# Altium footprint library 封装库.PcbLib: 755 footprints (part 23 of 48)
Each footprint in its own frame and in the unit in brackets; x right, y up, seen from the top. Pads: shape width x height; smd on the part's side, far side on the other; paste and mask are expansions set on the pad; w line width, h text height; cw(c..) or ccw(c..) is an arc to the next point about the centre after c.
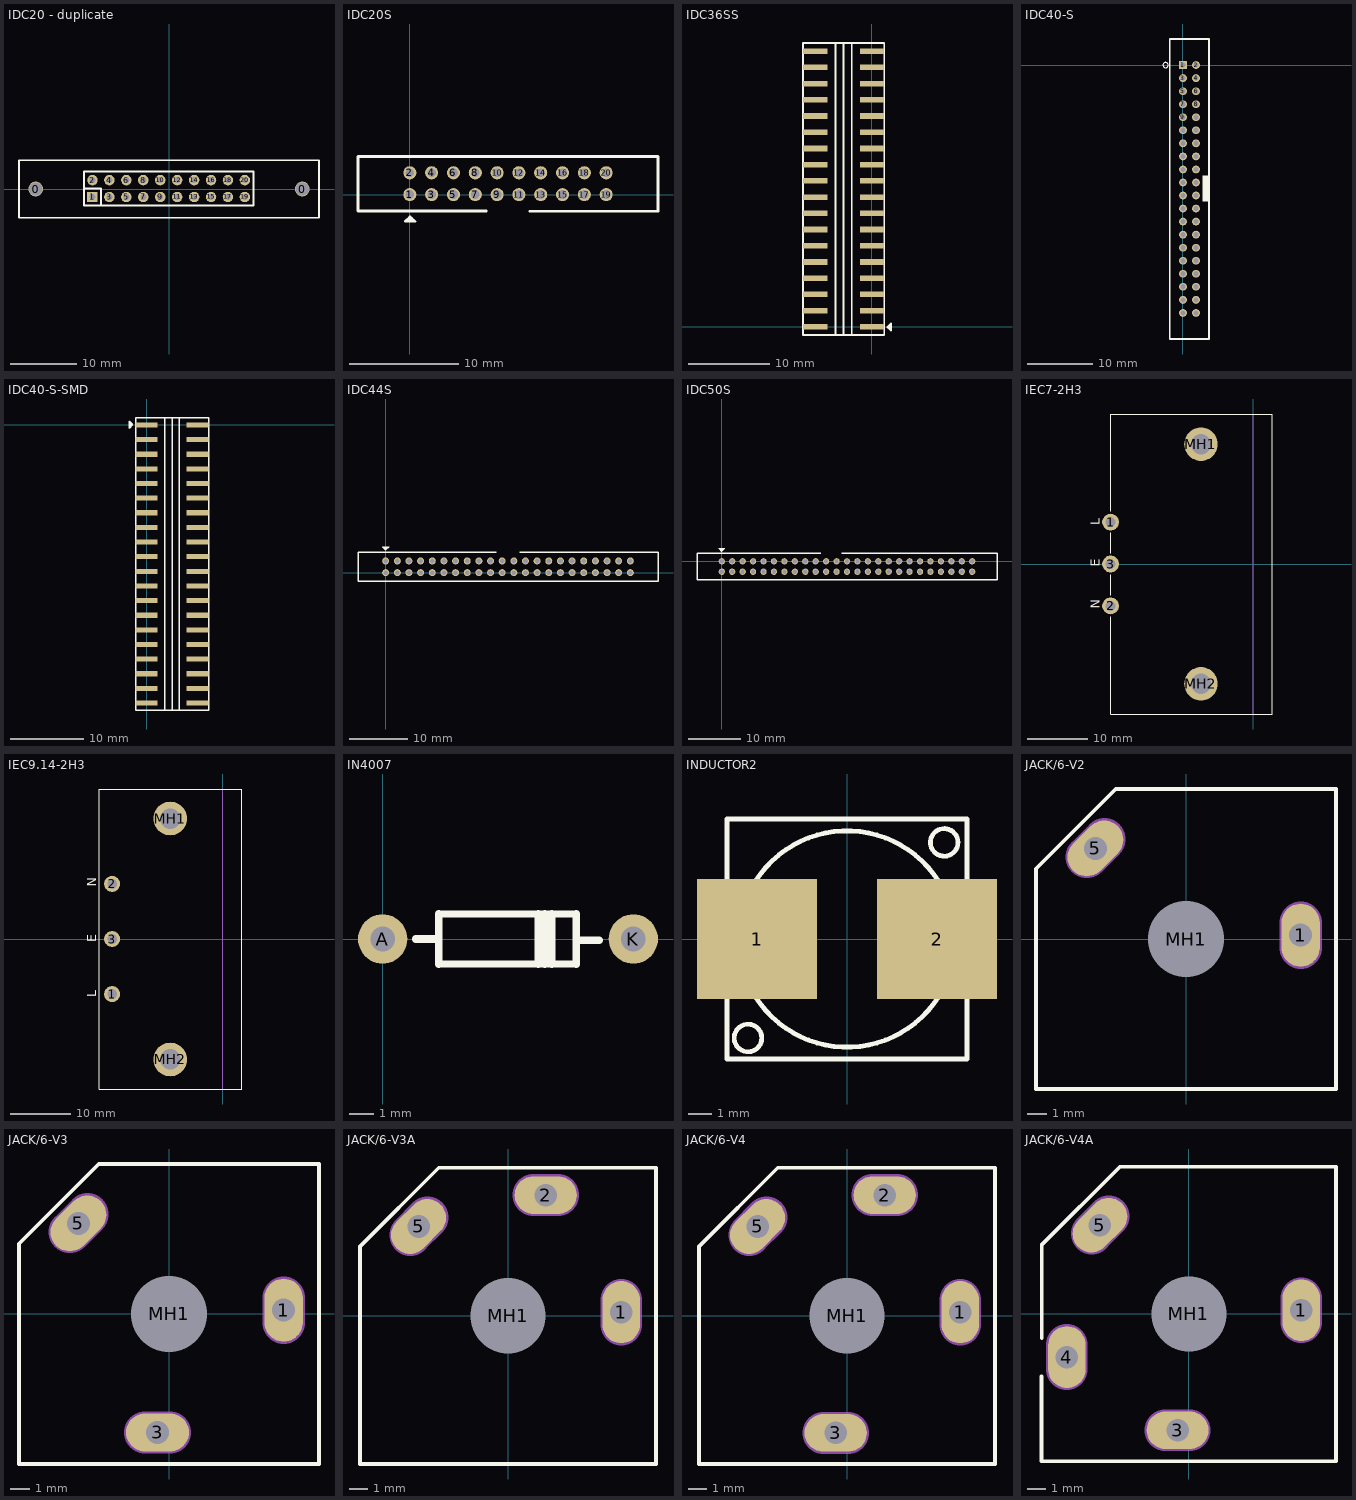
[diagram p22: the footprints below, top view; thin cyan lines are the x and y axes]

## IDC20 - duplicate [mm]
pads (22):
  round 2.2 hole 2: 0(-20,0) 0(20,0)
  rect 1.575x1.575 hole 0.9: 1(-11.476,-1.2)
  round 1.575 hole 0.9: 2(-11.476,1.34) 3(-8.936,-1.2) 4(-8.936,1.34) 5(-6.396,-1.2) 6(-6.396,1.34) 7(-3.856,-1.2) 8(-3.856,1.34) 9(-1.316,-1.2) 10(-1.316,1.34) 11(1.224,-1.2) 12(1.224,1.34) 13(3.764,-1.2) 14(3.764,1.34) 15(6.304,-1.2) 16(6.304,1.34) 17(8.844,-1.2) 18(8.844,1.34) 19(11.384,-1.2) 20(11.384,1.34)
Top Overlay:
  lines w0.254: -22.5,-4.3 -22.5,4.3 22.5,4.3 22.5,-4.3 -22.5,-4.3
  lines w0.305: -12.746,0.07 -10.206,0.07 -10.206,-2.47 ; -12.746,-2.47 12.654,-2.47 12.654,2.61 -12.746,2.61 -12.746,-2.47

## IDC20S [mm]
pads (20):
  round 1.2 hole 0.8: 1(-0.003,-0.008) 2(-0.003,1.992) 3(1.997,-0.008) 4(1.997,1.992) 5(3.997,-0.008) 6(3.997,1.992) 7(5.997,-0.008) 8(5.997,1.992) 9(7.997,-0.008) 10(7.997,1.992) 11(9.997,-0.008) 12(9.997,1.992) 13(11.997,-0.008) 14(11.997,1.992) 15(13.997,-0.008) 16(13.997,1.992) 17(15.997,-0.008) 18(15.997,1.992) 19(17.997,-0.008) 20(17.997,1.992)
Top Overlay:
  lines w0.2: 0.308,-2.294 -0.238,-2.294 -0.252,-2.281 0.103,-2.281 0.199,-2.185 0.199,-2.256 -0.028,-2.483 -0.028,-2.058 -0.003,-2.033 ; -0.003,-2.033 0.047,-2.033 0.497,-2.483 0.297,-2.483 -0.453,-2.483 -0.003,-2.033
  lines w0.254: 6.997,-1.508 -4.753,-1.508 -4.753,3.492 22.747,3.492 22.747,-1.508 ; 10.997,-1.533 22.747,-1.533

## IDC36SS [mm]
pads (36):
  rect 3x0.7 smd: 1(0.001,0.007) 2(-6.999,0.007) 3(0.001,2.007) 4(-6.999,2.007) 5(0.001,4.007) 6(-6.999,4.007) 7(0.001,6.007) 8(-6.999,6.007) 9(0.001,8.007) 10(-6.999,8.007) 11(0.001,10.007) 12(-6.999,10.007) 13(0.001,12.007) 14(-6.999,12.007) 15(0.001,14.007) 16(-6.999,14.007) 17(0.001,16.007) 18(-6.999,16.007) 19(0.001,18.007) 20(-6.999,18.007) 21(0.001,20.007) 22(-6.999,20.007) 23(0.001,22.007) 24(-6.999,22.007) 25(0.001,24.007) 26(-6.999,24.007) 27(0.001,26.007) 28(-6.999,26.007) 29(0.001,28.007) 30(-6.999,28.007) 31(0.001,30.007) 32(-6.999,30.007) 33(0.001,32.007) 34(-6.999,32.007) 35(0.001,34.007) 36(-6.999,34.007)
Top Overlay:
  lines w0.2: -4.499,-0.968 -4.499,35.007 ; -3.499,-0.993 -3.499,35.007 ; -2.499,-0.993 -2.499,35.007 ; 2.351,0.132 2.079,0.132 2.065,0.146 2.065,0.143 2.351,-0.143 2.076,-0.143 1.926,0.007 ; 1.926,0.007 1.926,-0.068 2.351,-0.493 2.351,0.432 1.926,0.007 ; -8.499,-0.993 1.501,-0.993 1.501,35.007 -8.499,35.007 -8.499,-0.993

## IDC40-S [mm]
pads (40):
  rect 1.2x1.2 hole 0.8: 1(0,0)
  round 1.2 hole 0.8: 2(2,0) 3(0,-2) 4(2,-2) 5(0,-4) 6(2,-4) 7(0,-6) 8(2,-6) 9(0,-8) 10(2,-8) 11(0,-10) 12(2,-10) 13(0,-12) 14(2,-12) 15(0,-14) 16(2,-14) 17(0,-16) 18(2,-16) 19(0,-18) 20(2,-18) 21(0,-20) 22(2,-20) 23(0,-22) 24(2,-22) 25(0,-24) 26(2,-24) 27(0,-26) 28(2,-26) 29(0,-28) 30(2,-28) 31(0,-30) 32(2,-30) 33(0,-32) 34(2,-32) 35(0,-34) 36(2,-34) 37(0,-36) 38(2,-36) 39(0,-38) 40(2,-38)
Top Overlay:
  circle w0.127: c-2.667,0 r0.402
  rectangle: 2.997,-18.923 3.997,-16.923
  rectangle: 3,-20.923 4,-18.923
  lines w0.254: -2,-40 -2,-42 3.918,-42 ; -2,-39.935 -2,-28 -2,4 -1,4 3,4 4,4 4,-28 4,-39.983 3.983,-40 ; 4,-42 4,-40

## IDC40-S-SMD [mm]
pads (40):
  rect 3x0.7 smd: 1(0,0) 2(7,0) 3(0,-2) 4(7,-2) 5(0,-4) 6(7,-4) 7(0,-6) 8(7,-6) 9(0,-8) 10(7,-8) 11(0,-10) 12(7,-10) 13(0,-12) 14(7,-12) 15(0,-14) 16(7,-14) 17(0,-16) 18(7,-16) 19(0,-18) 20(7,-18) 21(0,-20) 22(7,-20) 23(0,-22) 24(7,-22) 25(0,-24) 26(7,-24) 27(0,-26) 28(7,-26) 29(0,-28) 30(7,-28) 31(0,-30) 32(7,-30) 33(0,-32) 34(7,-32) 35(0,-34) 36(7,-34) 37(0,-36) 38(7,-36) 39(0,-38) 40(7,-38)
Top Overlay:
  lines w0.2: -2.35,-0.125 -2.078,-0.125 -2.064,-0.139 -2.064,-0.136 -2.35,0.15 -2.075,0.15 -1.925,0 ; 2.5,-39 2.5,1 ; 3.5,-39 3.5,1 ; 4.5,-39 4.5,0.975 ; -1.925,0 -1.925,0.075 -2.35,0.5 -2.35,-0.425 -1.925,0 ; -1.5,-39 8.5,-39 8.5,1 -1.5,1 -1.5,-39

## IDC44S [mm]
pads (44):
  round 1.2 hole 0.8: 1(0.003,1.994) 2(0.003,-0.006) 3(2.003,1.994) 4(2.003,-0.006) 5(4.003,1.994) 6(4.003,-0.006) 7(6.003,1.994) 8(6.003,-0.006) 9(8.003,1.994) 10(8.003,-0.006) 11(10.003,1.994) 12(10.003,-0.006) 13(12.003,1.994) 14(12.003,-0.006) 15(14.003,1.994) 16(14.003,-0.006) 17(16.003,1.994) 18(16.003,-0.006) 19(18.003,1.994) 20(18.003,-0.006) 21(20.003,1.994) 22(20.003,-0.006) 23(22.003,1.994) 24(22.003,-0.006) 25(24.003,1.994) 26(24.003,-0.006) 27(26.003,1.994) 28(26.003,-0.006) 29(28.003,1.994) 30(28.003,-0.006) 31(30.003,1.994) 32(30.003,-0.006) 33(32.003,1.994) 34(32.003,-0.006) 35(34.003,1.994) 36(34.003,-0.006) 37(36.003,1.994) 38(36.003,-0.006) 39(38.003,1.994) 40(38.003,-0.006) 41(40.003,1.994) 42(40.003,-0.006) 43(42.003,1.994) 44(42.003,-0.006)
Top Overlay:
  lines w0.2: 0.144,4.185 0.144,4.153 0.003,4.294 0.003,4.068 -0.29,4.36 0.394,4.36 -0.056,3.91 ; -0.606,4.46 -0.056,3.91 ; -0.606,4.46 -0.606,4.46 ; -0.606,4.46 0.394,4.46 0.594,4.46 0.044,3.91 -0.056,3.91
  lines w0.254: 19.003,3.494 -4.747,3.494 -4.747,-1.506 46.753,-1.506 46.753,3.494 23.003,3.494

## IDC50S [mm]
pads (50):
  round 1.2 hole 0.8: 1(0.006,-0.012) 2(0.006,-2.012) 3(2.006,-0.012) 4(2.006,-2.012) 5(4.006,-0.012) 6(4.006,-2.012) 7(6.006,-0.012) 8(6.006,-2.012) 9(8.006,-0.012) 10(8.006,-2.012) 11(10.006,-0.012) 12(10.006,-2.012) 13(12.006,-0.012) 14(12.006,-2.012) 15(14.006,-0.012) 16(14.006,-2.012) 17(16.006,-0.012) 18(16.006,-2.012) 19(18.006,-0.012) 20(18.006,-2.012) 21(20.006,-0.012) 22(20.006,-2.012) 23(22.006,-0.012) 24(22.006,-2.012) 25(24.006,-0.012) 26(24.006,-2.012) 27(26.006,-0.012) 28(26.006,-2.012) 29(28.006,-0.012) 30(28.006,-2.012) 31(30.006,-0.012) 32(30.006,-2.012) 33(32.006,-0.012) 34(32.006,-2.012) 35(34.006,-0.012) 36(34.006,-2.012) 37(36.006,-0.012) 38(36.006,-2.012) 39(38.006,-0.012) 40(38.006,-2.012) 41(40.006,-0.012) 42(40.006,-2.012) 43(42.006,-0.012) 44(42.006,-2.012) 45(44.006,-0.012) 46(44.006,-2.012) 47(46.006,-0.012) 48(46.006,-2.012) 49(48.006,-0.012) 50(48.006,-2.012)
Top Overlay:
  lines w0.2: 0.147,2.179 0.147,2.146 0.006,2.288 0.006,2.061 -0.287,2.354 0.397,2.354 -0.053,1.904 ; -0.053,1.904 -0.603,2.454 0.397,2.454 0.597,2.454 0.047,1.904 -0.053,1.904
  lines w0.254: 19.006,1.488 -4.744,1.488 -4.744,-3.512 52.756,-3.512 52.756,1.488 23.006,1.488

## IEC7-2H3 [mm] "Mains Power Outlet, IEC60 320-2-2 F, PC Flange Rear Mount"
height 30.4
pads (5):
  round 2.8 hole 1.7: 1(-23.8,7) 2(-23.8,-7) 3(-23.8,0)
  round 5.6 hole 3.4: MH1(-8.7,20) MH2(-8.7,-20)
Top Overlay:
  lines w0.2: -23.8,-8.8 -23.8,-25.05 3.2,-25.05 3.2,25.05 -23.8,25.05 -23.8,8.8 ; -23.8,-5.2 -23.8,-1.8 ; -23.8,1.8 -23.8,5.2
  text "L" at -25.6,6.5 h1.5
  text "E" at -25.6,-0.5 h1.5
  text "N" at -25.6,-7.5 h1.5
Mechanical 1:
  lines w0.1: 0,-25.05 0,25.05
  text "PCB Edge" at -0.4,-24.4 h0.5

## IEC9.14-2H3 [mm] "Mains Power Inlet, IEC60 320-1 C14, PC Flange Rear Mount"
height 27.8
pads (5):
  round 2.65 hole 1.6: 1(-18.35,-9.14) 2(-18.35,9.14) 3(-18.35,0)
  round 5.6 hole 3.4: MH1(-8.7,20) MH2(-8.7,-20)
Top Overlay:
  lines w0.2: -20.5,-24.9 -20.5,24.9 3.2,24.9 3.2,-24.9 -20.5,-24.9
  text "N" at -21,8.64 h1.5
  text "E" at -21,-0.5 h1.5
  text "L" at -21,-9.64 h1.5
Mechanical 1:
  lines w0.1: 0,-24.9 0,24.9
  text "PCB Edge" at -0.383,-24.4 h0.5

## IN4007 [mm]
pads (2):
  round 2 hole 1: A(0,0) K(10.16,0)
Top Overlay:
  lines w0.305: 1.35,0 2.282,0 ; 2.282,-1.016 2.282,1.016 ; 2.289,-1.007 7.841,-1.014 ; 2.289,1.007 7.841,1.014 ; 6.3,-1.016 6.3,1.016 ; 6.575,-1.016 6.575,1.016 ; 6.85,-1.016 6.85,1.016 ; 7.853,-1.016 7.853,1.016 ; 7.853,-0.05 8.785,-0.05

## INDUCTOR2 [mm]
pads (2):
  rect 5.08x5.08 smd: 1(-3.81,0) 2(3.81,0)
Top Overlay:
  circle w0.203: c4.115,4.089 r0.584
  circle w0.203: c-4.191,-4.191 r0.584
  circle w0.203: c0,0 r4.579
  lines w0.203: -5.08,-5.08 -5.08,5.08 5.08,5.08 5.08,-5.08 -5.08,-5.08

## JACK/6-V2 [mm] "Connector; Jack Socket, 1/4\" [6.5mm], Thru-Hole, 2 Position, Vertical, Body 15.7 x 15.7 x 31 mm (WxTxH)"
height 31.1
pads (3):
  oval 2x3.3 hole 1.2: 1(6,0.2)
  oval 2x3.3 hole 1.2 rot 135: 5(-4.738,4.738)
  round 3.7 hole 4: MH1(0,0)
Top Overlay:
  lines w0.2: -7.85,-7.85 7.85,-7.85 7.85,7.85 -3.675,7.85 -7.85,3.675 -7.85,-7.85
Mechanical 1:
  lines w1.2: -5.185,4.295 -4.266,5.214 ; 6,-0.45 6,0.85
  text "Alert PCB fab to slot details" at -7.9,9.66 h0.3
  text "Slot 1.2x2.5mm, PTH" at -7.9,9.16 h0.3
  text "Assign keep-out area to slot" at -7.9,10.16 h0.3
  text "Mech 1 - Slot cut-out" at -7.9,8.66 h0.3
  text "Mech 2 - Clearance, move to internal plane if present" at -7.9,8.16 h0.3
Mechanical 2:
  lines w2.216: -5.185,4.295 -4.266,5.214 ; 6,-0.45 6,0.85

## JACK/6-V3 [mm] "Connector; Jack Socket, 1/4\" [6.5mm], Thru-Hole, 3 Position, Vertical, Body 15.7 x 15.7 x 31 mm (WxTxH)"
height 31.1
pads (4):
  oval 2x3.3 hole 1.2: 1(6,0.2)
  oval 3.3x2 hole 1.2: 3(-0.6,-6.2)
  oval 2x3.3 hole 1.2 rot 135: 5(-4.738,4.738)
  round 3.7 hole 4: MH1(0,0)
Top Overlay:
  lines w0.2: -7.85,-7.85 -7.85,3.675 -3.675,7.85 7.85,7.85 7.85,-7.85 -7.85,-7.85
Mechanical 1:
  lines w1.2: -5.185,4.295 -4.266,5.214 ; -1.25,-6.2 0.05,-6.2 ; 6,-0.45 6,0.85
  text "Mech 2 - Clearance, move to internal plane if present" at -7.9,8.16 h0.3
  text "Mech 1 - Slot cut-out" at -7.9,8.66 h0.3
  text "Assign keep-out area to slot" at -7.9,10.16 h0.3
  text "Slot 1.2x2.5mm, PTH" at -7.9,9.16 h0.3
  text "Alert PCB fab to slot details" at -7.9,9.66 h0.3
Mechanical 2:
  lines w2.216: -5.185,4.295 -4.266,5.214 ; -1.25,-6.2 0.05,-6.2 ; 6,-0.45 6,0.85

## JACK/6-V3A [mm] "Connector; Jack Socket, 1/4\" [6.5mm], Thru-Hole, 3 Position, Vertical, Body 15.7 x 15.7 x 31 mm (WxTxH)"
height 31.1
pads (4):
  oval 2x3.3 hole 1.2: 1(6,0.2)
  oval 3.3x2 hole 1.2: 2(2,6.4)
  oval 2x3.3 hole 1.2 rot 135: 5(-4.738,4.738)
  round 3.7 hole 4: MH1(0,0)
Top Overlay:
  lines w0.2: -7.85,-7.85 7.85,-7.85 7.85,7.85 -3.675,7.85 -7.85,3.675 -7.85,-7.85
Mechanical 1:
  lines w1.2: -5.185,4.295 -4.266,5.214 ; 1.35,6.4 2.65,6.4 ; 6,-0.45 6,0.85
  text "Mech 2 - Clearance, move to internal plane if present" at -7.9,8.16 h0.3
  text "Mech 1 - Slot cut-out" at -7.9,8.66 h0.3
  text "Assign keep-out area to slot" at -7.9,10.16 h0.3
  text "Slot 1.2x2.5mm, PTH" at -7.9,9.16 h0.3
  text "Alert PCB fab to slot details" at -7.9,9.66 h0.3
Mechanical 2:
  lines w2.216: -5.185,4.295 -4.266,5.214 ; 1.35,6.4 2.65,6.4 ; 6,-0.45 6,0.85

## JACK/6-V4 [mm] "Connector; Jack Socket, 1/4\" [6.5mm], Thru-Hole, 4 Position, Vertical, Body 15.7 x 15.7 x 31 mm (WxTxH)"
height 31.1
pads (5):
  oval 2x3.3 hole 1.2: 1(6,0.2)
  oval 3.3x2 hole 1.2: 2(2,6.4) 3(-0.6,-6.2)
  oval 2x3.3 hole 1.2 rot 135: 5(-4.738,4.738)
  round 3.7 hole 4: MH1(0,0)
Top Overlay:
  lines w0.2: -7.85,-7.85 7.85,-7.85 7.85,7.85 -3.675,7.85 -7.85,3.675 -7.85,-7.85
Mechanical 1:
  lines w1.2: -5.185,4.295 -4.266,5.214 ; -1.25,-6.2 0.05,-6.2 ; 1.35,6.4 2.65,6.4 ; 6,-0.45 6,0.85
  text "Mech 2 - Clearance, move to internal plane if present" at -7.9,8.16 h0.3
  text "Mech 1 - Slot cut-out" at -7.9,8.66 h0.3
  text "Assign keep-out area to slot" at -7.9,10.16 h0.3
  text "Slot 1.2x2.5mm, PTH" at -7.9,9.16 h0.3
  text "Alert PCB fab to slot details" at -7.9,9.66 h0.3
Mechanical 2:
  lines w2.216: -5.185,4.295 -4.266,5.214 ; -1.25,-6.2 0.05,-6.2 ; 1.35,6.4 2.65,6.4 ; 6,-0.45 6,0.85

## JACK/6-V4A [mm] "Connector; Jack Socket, 1/4\" [6.5mm], Thru-Hole, 4 Position, Vertical, Body 15.7 x 15.7 x 31 mm (WxTxH)"
height 31.1
pads (5):
  oval 2x3.3 hole 1.2: 1(6,0.2) 4(-6.5,-2.3)
  oval 3.3x2 hole 1.2: 3(-0.6,-6.2)
  oval 2x3.3 hole 1.2 rot 135: 5(-4.738,4.738)
  round 3.7 hole 4: MH1(0,0)
Top Overlay:
  lines w0.2: -7.85,-3.32 -7.85,-7.85 7.85,-7.85 7.85,7.85 -3.675,7.85 -7.85,3.675 -7.85,-1.28
Mechanical 1:
  lines w1.2: -6.5,-2.95 -6.5,-1.65 ; -5.185,4.295 -4.266,5.214 ; -1.25,-6.2 0.05,-6.2 ; 6,-0.45 6,0.85
  text "Mech 2 - Clearance, move to internal plane if present" at -7.9,8.16 h0.3
  text "Mech 1 - Slot cut-out" at -7.9,8.66 h0.3
  text "Assign keep-out area to slot" at -7.9,10.16 h0.3
  text "Slot 1.2x2.5mm, PTH" at -7.9,9.16 h0.3
  text "Alert PCB fab to slot details" at -7.9,9.66 h0.3
Mechanical 2:
  lines w2.216: -6.5,-2.95 -6.5,-1.65 ; -5.185,4.295 -4.266,5.214 ; -1.25,-6.2 0.05,-6.2 ; 6,-0.45 6,0.85